# Altium schematic symbol library jlcpcb_2025_04_capacitors_extended_0603.schlib: 3668 symbols (part 4 of 20) (continued)
## 0603N1R4B500CT
designator C?  Capacitance: 1.4pF  (hidden comment: *)
Capacitor, Ceramic (MLCC), 1.4pF, 50V, NP0, SMD 0603; Manufacturer: Walsin Tech Corp; Manufacturer Part Number: 0603N1R4B500CT; Package Size: 0603; JLCPCB Basic Part: No; JLCPCB Part Number: C458895; Supplier 1: LCSC; Category: Capacitors - MLCC; Supplier Part Number 1: C458895; Voltage Rating: 50V; Temperature Coefficient: NP0; RoHS: Yes; ComponentLink1Description: Datasheet; ComponentLink1URL: https://wmsc.lcsc.com/wmsc/upload/file/pdf/v2/lcsc/2304140030_Walsin-Tech-Corp-0603N1R4B500CT_C458895.pdf; ComponentLink2Description: JLCPCB Part URL; ComponentLink2URL: https://jlcpcb.com/partdetail/C458895; ComponentLink3Description: LCSC Part URL; ComponentLink3URL: https://lcsc.com/product-detail/Multilayer-Ceramic-Capacitors-MLCC---SMD-SMT_Walsin-Tech-Corp-Walsin-Tech-Corp-0603N1R4B500CT_C458895.html
footprint CAP-0603 (0603 (1608M) Capacitor)
pins: 1, 2

## 0603N1R5B500CT
designator C?  Capacitance: 1.5pF  (hidden comment: *)
Capacitor, Ceramic (MLCC), 1.5pF, 50V, NP0, SMD 0603; Manufacturer: Walsin Tech Corp; Manufacturer Part Number: 0603N1R5B500CT; Package Size: 0603; JLCPCB Basic Part: No; JLCPCB Part Number: C123541; Supplier 1: LCSC; Category: Capacitors - MLCC; Supplier Part Number 1: C123541; Voltage Rating: 50V; Temperature Coefficient: NP0; RoHS: Yes; ComponentLink1Description: Datasheet; ComponentLink1URL: https://wmsc.lcsc.com/wmsc/upload/file/pdf/v2/lcsc/2304140030_Walsin-Tech-Corp-0603N1R5B500CT_C123541.pdf; ComponentLink2Description: JLCPCB Part URL; ComponentLink2URL: https://jlcpcb.com/partdetail/C123541; ComponentLink3Description: LCSC Part URL; ComponentLink3URL: https://lcsc.com/product-detail/Multilayer-Ceramic-Capacitors-MLCC---SMD-SMT_Walsin-Tech-Corp-Walsin-Tech-Corp-0603N1R5B500CT_C123541.html
footprint CAP-0603 (0603 (1608M) Capacitor)
pins: 1, 2

## 0603N1R5C500CT
designator C?  Capacitance: 1.5pF  (hidden comment: *)
Capacitor, Ceramic (MLCC), 1.5pF, 50V, NP0, SMD 0603; Manufacturer: Walsin Tech Corp; Manufacturer Part Number: 0603N1R5C500CT; Package Size: 0603; JLCPCB Basic Part: No; JLCPCB Part Number: C388037; Supplier 1: LCSC; Category: Capacitors - MLCC; Supplier Part Number 1: C388037; Voltage Rating: 50V; Temperature Coefficient: NP0; RoHS: Yes; ComponentLink1Description: Datasheet; ComponentLink1URL: https://wmsc.lcsc.com/wmsc/upload/file/pdf/v2/lcsc/2304140030_Walsin-Tech-Corp-0603N1R5C500CT_C388037.pdf; ComponentLink2Description: JLCPCB Part URL; ComponentLink2URL: https://jlcpcb.com/partdetail/C388037; ComponentLink3Description: LCSC Part URL; ComponentLink3URL: https://lcsc.com/product-detail/Multilayer-Ceramic-Capacitors-MLCC---SMD-SMT_Walsin-Tech-Corp-Walsin-Tech-Corp-0603N1R5C500CT_C388037.html
footprint CAP-0603 (0603 (1608M) Capacitor)
pins: 1, 2

## 0603N1R8B500CT
designator C?  Capacitance: 1.8pF  (hidden comment: *)
Capacitor, Ceramic (MLCC), 1.8pF, 50V, NP0, SMD 0603; Manufacturer: Walsin Tech Corp; Manufacturer Part Number: 0603N1R8B500CT; Package Size: 0603; JLCPCB Basic Part: No; JLCPCB Part Number: C152917; Supplier 1: LCSC; Category: Capacitors - MLCC; Supplier Part Number 1: C152917; Voltage Rating: 50V; Temperature Coefficient: NP0; RoHS: Yes; ComponentLink1Description: Datasheet; ComponentLink1URL: https://wmsc.lcsc.com/wmsc/upload/file/pdf/v2/lcsc/2304140030_Walsin-Tech-Corp-0603N1R8B500CT_C152917.pdf; ComponentLink2Description: JLCPCB Part URL; ComponentLink2URL: https://jlcpcb.com/partdetail/C152917; ComponentLink3Description: LCSC Part URL; ComponentLink3URL: https://lcsc.com/product-detail/Multilayer-Ceramic-Capacitors-MLCC---SMD-SMT_Walsin-Tech-Corp-Walsin-Tech-Corp-0603N1R8B500CT_C152917.html
footprint CAP-0603 (0603 (1608M) Capacitor)
pins: 1, 2

## 0603N1R8C500CT
designator C?  Capacitance: 1.8pF  (hidden comment: *)
Capacitor, Ceramic (MLCC), 1.8pF, 50V, NP0, SMD 0603; Manufacturer: Walsin Tech Corp; Manufacturer Part Number: 0603N1R8C500CT; Package Size: 0603; JLCPCB Basic Part: No; JLCPCB Part Number: C296051; Supplier 1: LCSC; Category: Capacitors - MLCC; Supplier Part Number 1: C296051; Voltage Rating: 50V; Temperature Coefficient: NP0; RoHS: Yes; ComponentLink1Description: Datasheet; ComponentLink1URL: https://wmsc.lcsc.com/wmsc/upload/file/pdf/v2/lcsc/2304140030_Walsin-Tech-Corp-0603N1R8C500CT_C296051.pdf; ComponentLink2Description: JLCPCB Part URL; ComponentLink2URL: https://jlcpcb.com/partdetail/C296051; ComponentLink3Description: LCSC Part URL; ComponentLink3URL: https://lcsc.com/product-detail/Multilayer-Ceramic-Capacitors-MLCC---SMD-SMT_Walsin-Tech-Corp-Walsin-Tech-Corp-0603N1R8C500CT_C296051.html
footprint CAP-0603 (0603 (1608M) Capacitor)
pins: 1, 2

## 0603N2R0B500CT
designator C?  Capacitance: 2pF  (hidden comment: *)
Capacitor, Ceramic (MLCC), 2pF, 50V, NP0, SMD 0603; Manufacturer: Walsin Tech Corp; Manufacturer Part Number: 0603N2R0B500CT; Package Size: 0603; JLCPCB Basic Part: No; JLCPCB Part Number: C152912; Supplier 1: LCSC; Category: Capacitors - MLCC; Supplier Part Number 1: C152912; Voltage Rating: 50V; Temperature Coefficient: NP0; RoHS: Yes; ComponentLink1Description: Datasheet; ComponentLink1URL: https://wmsc.lcsc.com/wmsc/upload/file/pdf/v2/lcsc/2304140030_Walsin-Tech-Corp-0603N2R0B500CT_C152912.pdf; ComponentLink2Description: JLCPCB Part URL; ComponentLink2URL: https://jlcpcb.com/partdetail/C152912; ComponentLink3Description: LCSC Part URL; ComponentLink3URL: https://lcsc.com/product-detail/Multilayer-Ceramic-Capacitors-MLCC---SMD-SMT_Walsin-Tech-Corp-Walsin-Tech-Corp-0603N2R0B500CT_C152912.html
footprint CAP-0603 (0603 (1608M) Capacitor)
pins: 1, 2

## 0603N2R0C251CT
designator C?  Capacitance: 2pF  (hidden comment: *)
Capacitor, Ceramic (MLCC), 2pF, 250V, NP0, SMD 0603; Manufacturer: Walsin Tech Corp; Manufacturer Part Number: 0603N2R0C251CT; Package Size: 0603; JLCPCB Basic Part: No; JLCPCB Part Number: C555555; Supplier 1: LCSC; Category: Capacitors - MLCC; Supplier Part Number 1: C555555; Voltage Rating: 250V; Temperature Coefficient: NP0; RoHS: Yes; ComponentLink1Description: Datasheet; ComponentLink1URL: https://wmsc.lcsc.com/wmsc/upload/file/pdf/v2/lcsc/2304140030_Walsin-Tech-Corp-0603N2R0C251CT_C555555.pdf; ComponentLink2Description: JLCPCB Part URL; ComponentLink2URL: https://jlcpcb.com/partdetail/C555555; ComponentLink3Description: LCSC Part URL; ComponentLink3URL: https://lcsc.com/product-detail/Multilayer-Ceramic-Capacitors-MLCC---SMD-SMT_Walsin-Tech-Corp-Walsin-Tech-Corp-0603N2R0C251CT_C555555.html
footprint CAP-0603 (0603 (1608M) Capacitor)
pins: 1, 2

## 0603N2R0C500CT
designator C?  Capacitance: 2pF  (hidden comment: *)
Capacitor, Ceramic (MLCC), 2pF, 50V, NP0, SMD 0603; Manufacturer: Walsin Tech Corp; Manufacturer Part Number: 0603N2R0C500CT; Package Size: 0603; JLCPCB Basic Part: No; JLCPCB Part Number: C123547; Supplier 1: LCSC; Category: Capacitors - MLCC; Supplier Part Number 1: C123547; Voltage Rating: 50V; Temperature Coefficient: NP0; RoHS: Yes; ComponentLink1Description: Datasheet; ComponentLink1URL: https://wmsc.lcsc.com/wmsc/upload/file/pdf/v2/lcsc/2304140030_Walsin-Tech-Corp-0603N2R0C500CT_C123547.pdf; ComponentLink2Description: JLCPCB Part URL; ComponentLink2URL: https://jlcpcb.com/partdetail/C123547; ComponentLink3Description: LCSC Part URL; ComponentLink3URL: https://lcsc.com/product-detail/Multilayer-Ceramic-Capacitors-MLCC---SMD-SMT_Walsin-Tech-Corp-Walsin-Tech-Corp-0603N2R0C500CT_C123547.html
footprint CAP-0603 (0603 (1608M) Capacitor)
pins: 1, 2

## 0603N2R2B500CT
designator C?  Capacitance: 2.2pF  (hidden comment: *)
Capacitor, Ceramic (MLCC), 2.2pF, 50V, NP0, SMD 0603; Manufacturer: Walsin Tech Corp; Manufacturer Part Number: 0603N2R2B500CT; Package Size: 0603; JLCPCB Basic Part: No; JLCPCB Part Number: C123548; Supplier 1: LCSC; Category: Capacitors - MLCC; Supplier Part Number 1: C123548; Voltage Rating: 50V; Temperature Coefficient: NP0; RoHS: Yes; ComponentLink1Description: Datasheet; ComponentLink1URL: https://wmsc.lcsc.com/wmsc/upload/file/pdf/v2/lcsc/2304140030_Walsin-Tech-Corp-0603N2R2B500CT_C123548.pdf; ComponentLink2Description: JLCPCB Part URL; ComponentLink2URL: https://jlcpcb.com/partdetail/C123548; ComponentLink3Description: LCSC Part URL; ComponentLink3URL: https://lcsc.com/product-detail/Multilayer-Ceramic-Capacitors-MLCC---SMD-SMT_Walsin-Tech-Corp-Walsin-Tech-Corp-0603N2R2B500CT_C123548.html
footprint CAP-0603 (0603 (1608M) Capacitor)
pins: 1, 2

## 0603N2R2C500CT
designator C?  Capacitance: 2.2pF  (hidden comment: *)
Capacitor, Ceramic (MLCC), 2.2pF, 50V, NP0, SMD 0603; Manufacturer: Walsin Tech Corp; Manufacturer Part Number: 0603N2R2C500CT; Package Size: 0603; JLCPCB Basic Part: No; JLCPCB Part Number: C388044; Supplier 1: LCSC; Category: Capacitors - MLCC; Supplier Part Number 1: C388044; Voltage Rating: 50V; Temperature Coefficient: NP0; RoHS: Yes; ComponentLink1Description: Datasheet; ComponentLink1URL: https://wmsc.lcsc.com/wmsc/upload/file/pdf/v2/lcsc/2304140030_Walsin-Tech-Corp-0603N2R2C500CT_C388044.pdf; ComponentLink2Description: JLCPCB Part URL; ComponentLink2URL: https://jlcpcb.com/partdetail/C388044; ComponentLink3Description: LCSC Part URL; ComponentLink3URL: https://lcsc.com/product-detail/Multilayer-Ceramic-Capacitors-MLCC---SMD-SMT_Walsin-Tech-Corp-Walsin-Tech-Corp-0603N2R2C500CT_C388044.html
footprint CAP-0603 (0603 (1608M) Capacitor)
pins: 1, 2

## 0603N2R2C500CT-C
designator C?  Capacitance: 2.2pF  (hidden comment: *)
Capacitor, Ceramic (MLCC), 2.2pF, 50V, NP0, SMD 0603; Manufacturer: Walsin Tech Corp; Manufacturer Part Number: 0603N2R2C500CT-C; Package Size: 0603; JLCPCB Basic Part: No; JLCPCB Part Number: C2991447; Supplier 1: LCSC; Category: Capacitors - MLCC; Supplier Part Number 1: C2991447; Voltage Rating: 50V; Temperature Coefficient: NP0; RoHS: Yes; ComponentLink1Description: Datasheet; ComponentLink1URL: https://wmsc.lcsc.com/wmsc/upload/file/pdf/v2/lcsc/2204131745_Walsin-Tech-Corp-0603N2R2C500CT-C_C2991447.pdf; ComponentLink2Description: JLCPCB Part URL; ComponentLink2URL: https://jlcpcb.com/partdetail/C2991447; ComponentLink3Description: LCSC Part URL; ComponentLink3URL: https://lcsc.com/product-detail/Multilayer-Ceramic-Capacitors-MLCC---SMD-SMT_Walsin-Tech-Corp-Walsin-Tech-Corp-0603N2R2C500CT-C_C2991447.html
footprint CAP-0603 (0603 (1608M) Capacitor)
pins: 1, 2

## 0603N2R4B500CT
designator C?  Capacitance: 2.4pF  (hidden comment: *)
Capacitor, Ceramic (MLCC), 2.4pF, 50V, NP0, SMD 0603; Manufacturer: Walsin Tech Corp; Manufacturer Part Number: 0603N2R4B500CT; Package Size: 0603; JLCPCB Basic Part: No; JLCPCB Part Number: C123550; Supplier 1: LCSC; Category: Capacitors - MLCC; Supplier Part Number 1: C123550; Voltage Rating: 50V; Temperature Coefficient: NP0; RoHS: Yes; ComponentLink1Description: Datasheet; ComponentLink1URL: https://wmsc.lcsc.com/wmsc/upload/file/pdf/v2/lcsc/2304140030_Walsin-Tech-Corp-0603N2R4B500CT_C123550.pdf; ComponentLink2Description: JLCPCB Part URL; ComponentLink2URL: https://jlcpcb.com/partdetail/C123550; ComponentLink3Description: LCSC Part URL; ComponentLink3URL: https://lcsc.com/product-detail/Multilayer-Ceramic-Capacitors-MLCC---SMD-SMT_Walsin-Tech-Corp-Walsin-Tech-Corp-0603N2R4B500CT_C123550.html
footprint CAP-0603 (0603 (1608M) Capacitor)
pins: 1, 2

## 0603N2R5B500CT
designator C?  Capacitance: 2.5pF  (hidden comment: *)
Capacitor, Ceramic (MLCC), 2.5pF, 50V, NP0, SMD 0603; Manufacturer: Walsin Tech Corp; Manufacturer Part Number: 0603N2R5B500CT; Package Size: 0603; JLCPCB Basic Part: No; JLCPCB Part Number: C123551; Supplier 1: LCSC; Category: Capacitors - MLCC; Supplier Part Number 1: C123551; Voltage Rating: 50V; Temperature Coefficient: NP0; RoHS: Yes; ComponentLink1Description: Datasheet; ComponentLink1URL: https://wmsc.lcsc.com/wmsc/upload/file/pdf/v2/lcsc/2304140030_Walsin-Tech-Corp-0603N2R5B500CT_C123551.pdf; ComponentLink2Description: JLCPCB Part URL; ComponentLink2URL: https://jlcpcb.com/partdetail/C123551; ComponentLink3Description: LCSC Part URL; ComponentLink3URL: https://lcsc.com/product-detail/Multilayer-Ceramic-Capacitors-MLCC---SMD-SMT_Walsin-Tech-Corp-Walsin-Tech-Corp-0603N2R5B500CT_C123551.html
footprint CAP-0603 (0603 (1608M) Capacitor)
pins: 1, 2

## 0603N2R5C500CT
designator C?  Capacitance: 2.5pF  (hidden comment: *)
Capacitor, Ceramic (MLCC), 2.5pF, 50V, NP0, SMD 0603; Manufacturer: Walsin Tech Corp; Manufacturer Part Number: 0603N2R5C500CT; Package Size: 0603; JLCPCB Basic Part: No; JLCPCB Part Number: C296059; Supplier 1: LCSC; Category: Capacitors - MLCC; Supplier Part Number 1: C296059; Voltage Rating: 50V; Temperature Coefficient: NP0; RoHS: Yes; ComponentLink1Description: Datasheet; ComponentLink1URL: https://wmsc.lcsc.com/wmsc/upload/file/pdf/v2/lcsc/2304140030_Walsin-Tech-Corp-0603N2R5C500CT_C296059.pdf; ComponentLink2Description: JLCPCB Part URL; ComponentLink2URL: https://jlcpcb.com/partdetail/C296059; ComponentLink3Description: LCSC Part URL; ComponentLink3URL: https://lcsc.com/product-detail/Multilayer-Ceramic-Capacitors-MLCC---SMD-SMT_Walsin-Tech-Corp-Walsin-Tech-Corp-0603N2R5C500CT_C296059.html
footprint CAP-0603 (0603 (1608M) Capacitor)
pins: 1, 2

## 0603N2R7B500CT
designator C?  Capacitance: 2.7pF  (hidden comment: *)
Capacitor, Ceramic (MLCC), 2.7pF, 50V, NP0, SMD 0603; Manufacturer: Walsin Tech Corp; Manufacturer Part Number: 0603N2R7B500CT; Package Size: 0603; JLCPCB Basic Part: No; JLCPCB Part Number: C123552; Supplier 1: LCSC; Category: Capacitors - MLCC; Supplier Part Number 1: C123552; Voltage Rating: 50V; Temperature Coefficient: NP0; RoHS: Yes; ComponentLink1Description: Datasheet; ComponentLink1URL: https://wmsc.lcsc.com/wmsc/upload/file/pdf/v2/lcsc/2304140030_Walsin-Tech-Corp-0603N2R7B500CT_C123552.pdf; ComponentLink2Description: JLCPCB Part URL; ComponentLink2URL: https://jlcpcb.com/partdetail/C123552; ComponentLink3Description: LCSC Part URL; ComponentLink3URL: https://lcsc.com/product-detail/Multilayer-Ceramic-Capacitors-MLCC---SMD-SMT_Walsin-Tech-Corp-Walsin-Tech-Corp-0603N2R7B500CT_C123552.html
footprint CAP-0603 (0603 (1608M) Capacitor)
pins: 1, 2

## 0603N2R7C500CT
designator C?  Capacitance: 2.7pF  (hidden comment: *)
Capacitor, Ceramic (MLCC), 2.7pF, 50V, NP0, SMD 0603; Manufacturer: Walsin Tech Corp; Manufacturer Part Number: 0603N2R7C500CT; Package Size: 0603; JLCPCB Basic Part: No; JLCPCB Part Number: C123553; Supplier 1: LCSC; Category: Capacitors - MLCC; Supplier Part Number 1: C123553; Voltage Rating: 50V; Temperature Coefficient: NP0; RoHS: Yes; ComponentLink1Description: Datasheet; ComponentLink1URL: https://wmsc.lcsc.com/wmsc/upload/file/pdf/v2/lcsc/2304140030_Walsin-Tech-Corp-0603N2R7C500CT_C123553.pdf; ComponentLink2Description: JLCPCB Part URL; ComponentLink2URL: https://jlcpcb.com/partdetail/C123553; ComponentLink3Description: LCSC Part URL; ComponentLink3URL: https://lcsc.com/product-detail/Multilayer-Ceramic-Capacitors-MLCC---SMD-SMT_Walsin-Tech-Corp-Walsin-Tech-Corp-0603N2R7C500CT_C123553.html
footprint CAP-0603 (0603 (1608M) Capacitor)
pins: 1, 2

## 0603N3R0B500CT
designator C?  Capacitance: 3pF  (hidden comment: *)
Capacitor, Ceramic (MLCC), 3pF, 50V, NP0, SMD 0603; Manufacturer: Walsin Tech Corp; Manufacturer Part Number: 0603N3R0B500CT; Package Size: 0603; JLCPCB Basic Part: No; JLCPCB Part Number: C123560; Supplier 1: LCSC; Category: Capacitors - MLCC; Supplier Part Number 1: C123560; Voltage Rating: 50V; Temperature Coefficient: NP0; RoHS: Yes; ComponentLink1Description: Datasheet; ComponentLink1URL: https://wmsc.lcsc.com/wmsc/upload/file/pdf/v2/lcsc/2304140030_Walsin-Tech-Corp-0603N3R0B500CT_C123560.pdf; ComponentLink2Description: JLCPCB Part URL; ComponentLink2URL: https://jlcpcb.com/partdetail/C123560; ComponentLink3Description: LCSC Part URL; ComponentLink3URL: https://lcsc.com/product-detail/Multilayer-Ceramic-Capacitors-MLCC---SMD-SMT_Walsin-Tech-Corp-Walsin-Tech-Corp-0603N3R0B500CT_C123560.html
footprint CAP-0603 (0603 (1608M) Capacitor)
pins: 1, 2

## 0603N3R3B500CT
designator C?  Capacitance: 3.3pF  (hidden comment: *)
Capacitor, Ceramic (MLCC), 3.3pF, 50V, NP0, SMD 0603; Manufacturer: Walsin Tech Corp; Manufacturer Part Number: 0603N3R3B500CT; Package Size: 0603; JLCPCB Basic Part: No; JLCPCB Part Number: C509265; Supplier 1: LCSC; Category: Capacitors - MLCC; Supplier Part Number 1: C509265; Voltage Rating: 50V; Temperature Coefficient: NP0; RoHS: Yes; ComponentLink1Description: Datasheet; ComponentLink1URL: https://wmsc.lcsc.com/wmsc/upload/file/pdf/v2/lcsc/2304140030_Walsin-Tech-Corp-0603N3R3B500CT_C509265.pdf; ComponentLink2Description: JLCPCB Part URL; ComponentLink2URL: https://jlcpcb.com/partdetail/C509265; ComponentLink3Description: LCSC Part URL; ComponentLink3URL: https://lcsc.com/product-detail/Multilayer-Ceramic-Capacitors-MLCC---SMD-SMT_Walsin-Tech-Corp-Walsin-Tech-Corp-0603N3R3B500CT_C509265.html
footprint CAP-0603 (0603 (1608M) Capacitor)
pins: 1, 2

## 0603N3R3C500CT
designator C?  Capacitance: 3.3pF  (hidden comment: *)
Capacitor, Ceramic (MLCC), 3.3pF, 50V, NP0, SMD 0603; Manufacturer: Walsin Tech Corp; Manufacturer Part Number: 0603N3R3C500CT; Package Size: 0603; JLCPCB Basic Part: No; JLCPCB Part Number: C123563; Supplier 1: LCSC; Category: Capacitors - MLCC; Supplier Part Number 1: C123563; Voltage Rating: 50V; Temperature Coefficient: NP0; RoHS: Yes; ComponentLink1Description: Datasheet; ComponentLink1URL: https://wmsc.lcsc.com/wmsc/upload/file/pdf/v2/lcsc/2304140030_Walsin-Tech-Corp-0603N3R3C500CT_C123563.pdf; ComponentLink2Description: JLCPCB Part URL; ComponentLink2URL: https://jlcpcb.com/partdetail/C123563; ComponentLink3Description: LCSC Part URL; ComponentLink3URL: https://lcsc.com/product-detail/Multilayer-Ceramic-Capacitors-MLCC---SMD-SMT_Walsin-Tech-Corp-Walsin-Tech-Corp-0603N3R3C500CT_C123563.html
footprint CAP-0603 (0603 (1608M) Capacitor)
pins: 1, 2

## 0603N3R5C500CT
designator C?  Capacitance: 3.5pF  (hidden comment: *)
Capacitor, Ceramic (MLCC), 3.5pF, 50V, NP0, SMD 0603; Manufacturer: Walsin Tech Corp; Manufacturer Part Number: 0603N3R5C500CT; Package Size: 0603; JLCPCB Basic Part: No; JLCPCB Part Number: C388052; Supplier 1: LCSC; Category: Capacitors - MLCC; Supplier Part Number 1: C388052; Voltage Rating: 50V; Temperature Coefficient: NP0; RoHS: Yes; ComponentLink1Description: Datasheet; ComponentLink1URL: https://wmsc.lcsc.com/wmsc/upload/file/pdf/v2/lcsc/2304140030_Walsin-Tech-Corp-0603N3R5C500CT_C388052.pdf; ComponentLink2Description: JLCPCB Part URL; ComponentLink2URL: https://jlcpcb.com/partdetail/C388052; ComponentLink3Description: LCSC Part URL; ComponentLink3URL: https://lcsc.com/product-detail/Multilayer-Ceramic-Capacitors-MLCC---SMD-SMT_Walsin-Tech-Corp-Walsin-Tech-Corp-0603N3R5C500CT_C388052.html
footprint CAP-0603 (0603 (1608M) Capacitor)
pins: 1, 2

## 0603N3R6C500CT
designator C?  Capacitance: 3.6pF  (hidden comment: *)
Capacitor, Ceramic (MLCC), 3.6pF, 50V, SMD 0603; Manufacturer: Walsin Tech Corp; Manufacturer Part Number: 0603N3R6C500CT; Package Size: 0603; JLCPCB Basic Part: No; JLCPCB Part Number: C296064; Supplier 1: LCSC; Category: Capacitors - MLCC; Supplier Part Number 1: C296064; Voltage Rating: 50V; RoHS: Yes; ComponentLink1Description: Datasheet; ComponentLink1URL: https://wmsc.lcsc.com/wmsc/upload/file/pdf/v2/lcsc/2304140030_Walsin-Tech-Corp-0603N3R6C500CT_C296064.pdf; ComponentLink2Description: JLCPCB Part URL; ComponentLink2URL: https://jlcpcb.com/partdetail/C296064; ComponentLink3Description: LCSC Part URL; ComponentLink3URL: https://lcsc.com/product-detail/Multilayer-Ceramic-Capacitors-MLCC---SMD-SMT_Walsin-Tech-Corp-Walsin-Tech-Corp-0603N3R6C500CT_C296064.html
footprint CAP-0603 (0603 (1608M) Capacitor)
pins: 1, 2

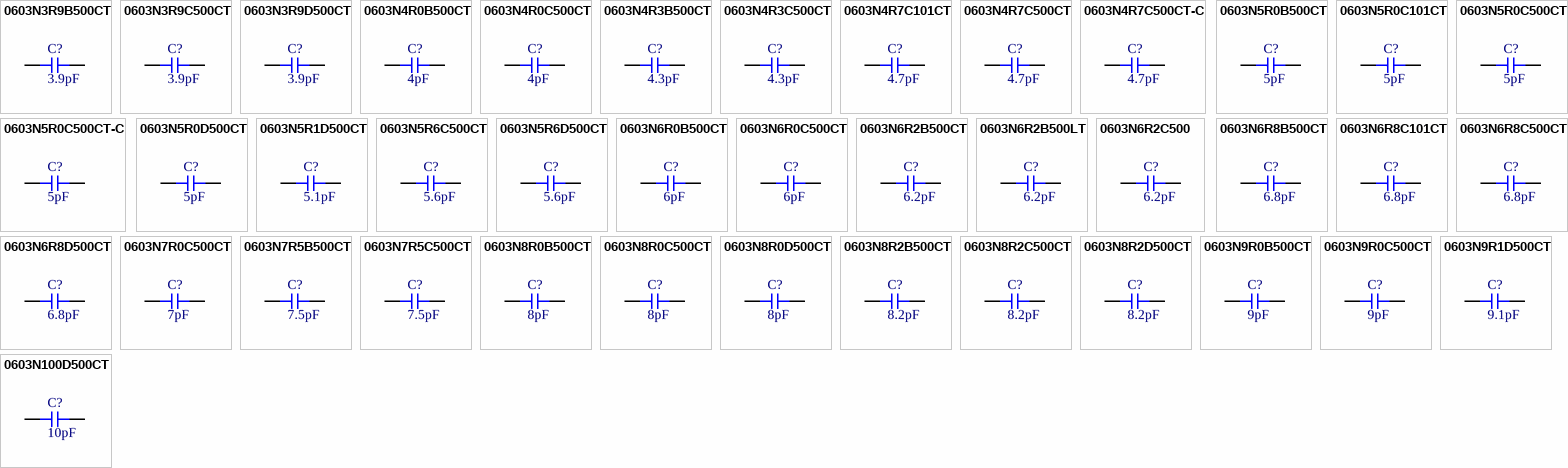
[diagram p15: symbols 0603N3R9B500CT to 0603N100D500CT]

## 0603N3R9B500CT
designator C?  Capacitance: 3.9pF  (hidden comment: *)
Capacitor, Ceramic (MLCC), 3.9pF, 50V, NP0, SMD 0603; Manufacturer: Walsin Tech Corp; Manufacturer Part Number: 0603N3R9B500CT; Package Size: 0603; JLCPCB Basic Part: No; JLCPCB Part Number: C123565; Supplier 1: LCSC; Category: Capacitors - MLCC; Supplier Part Number 1: C123565; Voltage Rating: 50V; Temperature Coefficient: NP0; RoHS: Yes; ComponentLink1Description: Datasheet; ComponentLink1URL: https://wmsc.lcsc.com/wmsc/upload/file/pdf/v2/lcsc/2304140030_Walsin-Tech-Corp-0603N3R9B500CT_C123565.pdf; ComponentLink2Description: JLCPCB Part URL; ComponentLink2URL: https://jlcpcb.com/partdetail/C123565; ComponentLink3Description: LCSC Part URL; ComponentLink3URL: https://lcsc.com/product-detail/Multilayer-Ceramic-Capacitors-MLCC---SMD-SMT_Walsin-Tech-Corp-Walsin-Tech-Corp-0603N3R9B500CT_C123565.html
footprint CAP-0603 (0603 (1608M) Capacitor)
pins: 1, 2

## 0603N3R9C500CT
designator C?  Capacitance: 3.9pF  (hidden comment: *)
Capacitor, Ceramic (MLCC), 3.9pF, 50V, NP0, SMD 0603; Manufacturer: Walsin Tech Corp; Manufacturer Part Number: 0603N3R9C500CT; Package Size: 0603; JLCPCB Basic Part: No; JLCPCB Part Number: C123566; Supplier 1: LCSC; Category: Capacitors - MLCC; Supplier Part Number 1: C123566; Voltage Rating: 50V; Temperature Coefficient: NP0; RoHS: Yes; ComponentLink1Description: Datasheet; ComponentLink1URL: https://wmsc.lcsc.com/wmsc/upload/file/pdf/v2/lcsc/2304140030_Walsin-Tech-Corp-0603N3R9C500CT_C123566.pdf; ComponentLink2Description: JLCPCB Part URL; ComponentLink2URL: https://jlcpcb.com/partdetail/C123566; ComponentLink3Description: LCSC Part URL; ComponentLink3URL: https://lcsc.com/product-detail/Multilayer-Ceramic-Capacitors-MLCC---SMD-SMT_Walsin-Tech-Corp-Walsin-Tech-Corp-0603N3R9C500CT_C123566.html
footprint CAP-0603 (0603 (1608M) Capacitor)
pins: 1, 2

## 0603N3R9D500CT
designator C?  Capacitance: 3.9pF  (hidden comment: *)
Capacitor, Ceramic (MLCC), 3.9pF, 50V, NP0, SMD 0603; Manufacturer: Walsin Tech Corp; Manufacturer Part Number: 0603N3R9D500CT; Package Size: 0603; JLCPCB Basic Part: No; JLCPCB Part Number: C458905; Supplier 1: LCSC; Category: Capacitors - MLCC; Supplier Part Number 1: C458905; Voltage Rating: 50V; Temperature Coefficient: NP0; RoHS: Yes; ComponentLink1Description: Datasheet; ComponentLink1URL: https://wmsc.lcsc.com/wmsc/upload/file/pdf/v2/lcsc/2304140030_Walsin-Tech-Corp-0603N3R9D500CT_C458905.pdf; ComponentLink2Description: JLCPCB Part URL; ComponentLink2URL: https://jlcpcb.com/partdetail/C458905; ComponentLink3Description: LCSC Part URL; ComponentLink3URL: https://lcsc.com/product-detail/Multilayer-Ceramic-Capacitors-MLCC---SMD-SMT_Walsin-Tech-Corp-Walsin-Tech-Corp-0603N3R9D500CT_C458905.html
footprint CAP-0603 (0603 (1608M) Capacitor)
pins: 1, 2

## 0603N4R0B500CT
designator C?  Capacitance: 4pF  (hidden comment: *)
Capacitor, Ceramic (MLCC), 4pF, 50V, NP0, SMD 0603; Manufacturer: Walsin Tech Corp; Manufacturer Part Number: 0603N4R0B500CT; Package Size: 0603; JLCPCB Basic Part: No; JLCPCB Part Number: C123574; Supplier 1: LCSC; Category: Capacitors - MLCC; Supplier Part Number 1: C123574; Voltage Rating: 50V; Temperature Coefficient: NP0; RoHS: Yes; ComponentLink1Description: Datasheet; ComponentLink1URL: https://wmsc.lcsc.com/wmsc/upload/file/pdf/v2/lcsc/2304140030_Walsin-Tech-Corp-0603N4R0B500CT_C123574.pdf; ComponentLink2Description: JLCPCB Part URL; ComponentLink2URL: https://jlcpcb.com/partdetail/C123574; ComponentLink3Description: LCSC Part URL; ComponentLink3URL: https://lcsc.com/product-detail/Multilayer-Ceramic-Capacitors-MLCC---SMD-SMT_Walsin-Tech-Corp-Walsin-Tech-Corp-0603N4R0B500CT_C123574.html
footprint CAP-0603 (0603 (1608M) Capacitor)
pins: 1, 2

## 0603N4R0C500CT
designator C?  Capacitance: 4pF  (hidden comment: *)
Capacitor, Ceramic (MLCC), 4pF, 50V, NP0, SMD 0603; Manufacturer: Walsin Tech Corp; Manufacturer Part Number: 0603N4R0C500CT; Package Size: 0603; JLCPCB Basic Part: No; JLCPCB Part Number: C123575; Supplier 1: LCSC; Category: Capacitors - MLCC; Supplier Part Number 1: C123575; Voltage Rating: 50V; Temperature Coefficient: NP0; RoHS: Yes; ComponentLink1Description: Datasheet; ComponentLink1URL: https://wmsc.lcsc.com/wmsc/upload/file/pdf/v2/lcsc/2304140030_Walsin-Tech-Corp-0603N4R0C500CT_C123575.pdf; ComponentLink2Description: JLCPCB Part URL; ComponentLink2URL: https://jlcpcb.com/partdetail/C123575; ComponentLink3Description: LCSC Part URL; ComponentLink3URL: https://lcsc.com/product-detail/Multilayer-Ceramic-Capacitors-MLCC---SMD-SMT_Walsin-Tech-Corp-Walsin-Tech-Corp-0603N4R0C500CT_C123575.html
footprint CAP-0603 (0603 (1608M) Capacitor)
pins: 1, 2

## 0603N4R3B500CT
designator C?  Capacitance: 4.3pF  (hidden comment: *)
Capacitor, Ceramic (MLCC), 4.3pF, 50V, NP0, SMD 0603; Manufacturer: Walsin Tech Corp; Manufacturer Part Number: 0603N4R3B500CT; Package Size: 0603; JLCPCB Basic Part: No; JLCPCB Part Number: C388056; Supplier 1: LCSC; Category: Capacitors - MLCC; Supplier Part Number 1: C388056; Voltage Rating: 50V; Temperature Coefficient: NP0; RoHS: Yes; ComponentLink1Description: Datasheet; ComponentLink1URL: https://wmsc.lcsc.com/wmsc/upload/file/pdf/v2/lcsc/2304140030_Walsin-Tech-Corp-0603N4R3B500CT_C388056.pdf; ComponentLink2Description: JLCPCB Part URL; ComponentLink2URL: https://jlcpcb.com/partdetail/C388056; ComponentLink3Description: LCSC Part URL; ComponentLink3URL: https://lcsc.com/product-detail/Multilayer-Ceramic-Capacitors-MLCC---SMD-SMT_Walsin-Tech-Corp-Walsin-Tech-Corp-0603N4R3B500CT_C388056.html
footprint CAP-0603 (0603 (1608M) Capacitor)
pins: 1, 2

## 0603N4R3C500CT
designator C?  Capacitance: 4.3pF  (hidden comment: *)
Capacitor, Ceramic (MLCC), 4.3pF, 50V, NP0, SMD 0603; Manufacturer: Walsin Tech Corp; Manufacturer Part Number: 0603N4R3C500CT; Package Size: 0603; JLCPCB Basic Part: No; JLCPCB Part Number: C424850; Supplier 1: LCSC; Category: Capacitors - MLCC; Supplier Part Number 1: C424850; Voltage Rating: 50V; Temperature Coefficient: NP0; RoHS: Yes; ComponentLink1Description: Datasheet; ComponentLink1URL: https://wmsc.lcsc.com/wmsc/upload/file/pdf/v2/lcsc/2304140030_Walsin-Tech-Corp-0603N4R3C500CT_C424850.pdf; ComponentLink2Description: JLCPCB Part URL; ComponentLink2URL: https://jlcpcb.com/partdetail/C424850; ComponentLink3Description: LCSC Part URL; ComponentLink3URL: https://lcsc.com/product-detail/Multilayer-Ceramic-Capacitors-MLCC---SMD-SMT_Walsin-Tech-Corp-Walsin-Tech-Corp-0603N4R3C500CT_C424850.html
footprint CAP-0603 (0603 (1608M) Capacitor)
pins: 1, 2

## 0603N4R7C101CT
designator C?  Capacitance: 4.7pF  (hidden comment: *)
Capacitor, Ceramic (MLCC), 4.7pF, 100V, NP0, SMD 0603; Manufacturer: Walsin Tech Corp; Manufacturer Part Number: 0603N4R7C101CT; Package Size: 0603; JLCPCB Basic Part: No; JLCPCB Part Number: C2918066; Supplier 1: LCSC; Category: Capacitors - MLCC; Supplier Part Number 1: C2918066; Voltage Rating: 100V; Temperature Coefficient: NP0; RoHS: Yes; ComponentLink1Description: Datasheet; ComponentLink1URL: https://wmsc.lcsc.com/wmsc/upload/file/pdf/v2/lcsc/2111181830_Walsin-Tech-Corp-0603N4R7C101CT_C2918066.pdf; ComponentLink2Description: JLCPCB Part URL; ComponentLink2URL: https://jlcpcb.com/partdetail/C2918066; ComponentLink3Description: LCSC Part URL; ComponentLink3URL: https://lcsc.com/product-detail/Multilayer-Ceramic-Capacitors-MLCC---SMD-SMT_Walsin-Tech-Corp-Walsin-Tech-Corp-0603N4R7C101CT_C2918066.html
footprint CAP-0603 (0603 (1608M) Capacitor)
pins: 1, 2

## 0603N4R7C500CT
designator C?  Capacitance: 4.7pF  (hidden comment: *)
Capacitor, Ceramic (MLCC), 4.7pF, 50V, NP0, SMD 0603; Manufacturer: Walsin Tech Corp; Manufacturer Part Number: 0603N4R7C500CT; Package Size: 0603; JLCPCB Basic Part: No; JLCPCB Part Number: C314302; Supplier 1: LCSC; Category: Capacitors - MLCC; Supplier Part Number 1: C314302; Voltage Rating: 50V; Temperature Coefficient: NP0; RoHS: Yes; ComponentLink1Description: Datasheet; ComponentLink1URL: https://wmsc.lcsc.com/wmsc/upload/file/pdf/v2/lcsc/2304140030_Walsin-Tech-Corp-0603N4R7C500CT_C314302.pdf; ComponentLink2Description: JLCPCB Part URL; ComponentLink2URL: https://jlcpcb.com/partdetail/C314302; ComponentLink3Description: LCSC Part URL; ComponentLink3URL: https://lcsc.com/product-detail/Multilayer-Ceramic-Capacitors-MLCC---SMD-SMT_Walsin-Tech-Corp-Walsin-Tech-Corp-0603N4R7C500CT_C314302.html
footprint CAP-0603 (0603 (1608M) Capacitor)
pins: 1, 2

## 0603N4R7C500CT-C
designator C?  Capacitance: 4.7pF  (hidden comment: *)
Capacitor, Ceramic (MLCC), 4.7pF, 50V, NP0, SMD 0603; Manufacturer: Walsin Tech Corp; Manufacturer Part Number: 0603N4R7C500CT-C; Package Size: 0603; JLCPCB Basic Part: No; JLCPCB Part Number: C2991432; Supplier 1: LCSC; Category: Capacitors - MLCC; Supplier Part Number 1: C2991432; Voltage Rating: 50V; Temperature Coefficient: NP0; RoHS: Yes; ComponentLink1Description: Datasheet; ComponentLink1URL: https://wmsc.lcsc.com/wmsc/upload/file/pdf/v2/lcsc/2204131745_Walsin-Tech-Corp-0603N4R7C500CT-C_C2991432.pdf; ComponentLink2Description: JLCPCB Part URL; ComponentLink2URL: https://jlcpcb.com/partdetail/C2991432; ComponentLink3Description: LCSC Part URL; ComponentLink3URL: https://lcsc.com/product-detail/Multilayer-Ceramic-Capacitors-MLCC---SMD-SMT_Walsin-Tech-Corp-Walsin-Tech-Corp-0603N4R7C500CT-C_C2991432.html
footprint CAP-0603 (0603 (1608M) Capacitor)
pins: 1, 2

## 0603N5R0B500CT
designator C?  Capacitance: 5pF  (hidden comment: *)
Capacitor, Ceramic (MLCC), 5pF, 50V, NP0, SMD 0603; Manufacturer: Walsin Tech Corp; Manufacturer Part Number: 0603N5R0B500CT; Package Size: 0603; JLCPCB Basic Part: No; JLCPCB Part Number: C237228; Supplier 1: LCSC; Category: Capacitors - MLCC; Supplier Part Number 1: C237228; Voltage Rating: 50V; Temperature Coefficient: NP0; RoHS: Yes; ComponentLink1Description: Datasheet; ComponentLink1URL: https://wmsc.lcsc.com/wmsc/upload/file/pdf/v2/lcsc/2304140030_Walsin-Tech-Corp-0603N5R0B500CT_C237228.pdf; ComponentLink2Description: JLCPCB Part URL; ComponentLink2URL: https://jlcpcb.com/partdetail/C237228; ComponentLink3Description: LCSC Part URL; ComponentLink3URL: https://lcsc.com/product-detail/Multilayer-Ceramic-Capacitors-MLCC---SMD-SMT_Walsin-Tech-Corp-Walsin-Tech-Corp-0603N5R0B500CT_C237228.html
footprint CAP-0603 (0603 (1608M) Capacitor)
pins: 1, 2

## 0603N5R0C101CT
designator C?  Capacitance: 5pF  (hidden comment: *)
Capacitor, Ceramic (MLCC), 5pF, 100V, NP0, SMD 0603; Manufacturer: Walsin Tech Corp; Manufacturer Part Number: 0603N5R0C101CT; Package Size: 0603; JLCPCB Basic Part: No; JLCPCB Part Number: C123581; Supplier 1: LCSC; Category: Capacitors - MLCC; Supplier Part Number 1: C123581; Voltage Rating: 100V; Temperature Coefficient: NP0; RoHS: Yes; ComponentLink1Description: Datasheet; ComponentLink1URL: https://wmsc.lcsc.com/wmsc/upload/file/pdf/v2/lcsc/2304140030_Walsin-Tech-Corp-0603N5R0C101CT_C123581.pdf; ComponentLink2Description: JLCPCB Part URL; ComponentLink2URL: https://jlcpcb.com/partdetail/C123581; ComponentLink3Description: LCSC Part URL; ComponentLink3URL: https://lcsc.com/product-detail/Multilayer-Ceramic-Capacitors-MLCC---SMD-SMT_Walsin-Tech-Corp-Walsin-Tech-Corp-0603N5R0C101CT_C123581.html
footprint CAP-0603 (0603 (1608M) Capacitor)
pins: 1, 2

## 0603N5R0C500CT
designator C?  Capacitance: 5pF  (hidden comment: *)
Capacitor, Ceramic (MLCC), 5pF, 50V, NP0, SMD 0603; Manufacturer: Walsin Tech Corp; Manufacturer Part Number: 0603N5R0C500CT; Package Size: 0603; JLCPCB Basic Part: No; JLCPCB Part Number: C314284; Supplier 1: LCSC; Category: Capacitors - MLCC; Supplier Part Number 1: C314284; Voltage Rating: 50V; Temperature Coefficient: NP0; RoHS: Yes; ComponentLink1Description: Datasheet; ComponentLink1URL: https://wmsc.lcsc.com/wmsc/upload/file/pdf/v2/lcsc/2304140030_Walsin-Tech-Corp-0603N5R0C500CT_C314284.pdf; ComponentLink2Description: JLCPCB Part URL; ComponentLink2URL: https://jlcpcb.com/partdetail/C314284; ComponentLink3Description: LCSC Part URL; ComponentLink3URL: https://lcsc.com/product-detail/Multilayer-Ceramic-Capacitors-MLCC---SMD-SMT_Walsin-Tech-Corp-Walsin-Tech-Corp-0603N5R0C500CT_C314284.html
footprint CAP-0603 (0603 (1608M) Capacitor)
pins: 1, 2

## 0603N5R0C500CT-C
designator C?  Capacitance: 5pF  (hidden comment: *)
Capacitor, Ceramic (MLCC), 5pF, 50V, NP0, SMD 0603; Manufacturer: Walsin Tech Corp; Manufacturer Part Number: 0603N5R0C500CT-C; Package Size: 0603; JLCPCB Basic Part: No; JLCPCB Part Number: C2991462; Supplier 1: LCSC; Category: Capacitors - MLCC; Supplier Part Number 1: C2991462; Voltage Rating: 50V; Temperature Coefficient: NP0; RoHS: Yes; ComponentLink1Description: Datasheet; ComponentLink1URL: https://wmsc.lcsc.com/wmsc/upload/file/pdf/v2/lcsc/2204131745_Walsin-Tech-Corp-0603N5R0C500CT-C_C2991462.pdf; ComponentLink2Description: JLCPCB Part URL; ComponentLink2URL: https://jlcpcb.com/partdetail/C2991462; ComponentLink3Description: LCSC Part URL; ComponentLink3URL: https://lcsc.com/product-detail/Multilayer-Ceramic-Capacitors-MLCC---SMD-SMT_Walsin-Tech-Corp-Walsin-Tech-Corp-0603N5R0C500CT-C_C2991462.html
footprint CAP-0603 (0603 (1608M) Capacitor)
pins: 1, 2

## 0603N5R0D500CT
designator C?  Capacitance: 5pF  (hidden comment: *)
Capacitor, Ceramic (MLCC), 5pF, 50V, NP0, SMD 0603; Manufacturer: Walsin Tech Corp; Manufacturer Part Number: 0603N5R0D500CT; Package Size: 0603; JLCPCB Basic Part: No; JLCPCB Part Number: C2886129; Supplier 1: LCSC; Category: Capacitors - MLCC; Supplier Part Number 1: C2886129; Voltage Rating: 50V; Temperature Coefficient: NP0; RoHS: Yes; ComponentLink1Description: Datasheet; ComponentLink1URL: https://wmsc.lcsc.com/wmsc/upload/file/pdf/v2/lcsc/2108170930_Walsin-Tech-Corp-0603N5R0D500CT_C2886129.pdf; ComponentLink2Description: JLCPCB Part URL; ComponentLink2URL: https://jlcpcb.com/partdetail/C2886129; ComponentLink3Description: LCSC Part URL; ComponentLink3URL: https://lcsc.com/product-detail/Multilayer-Ceramic-Capacitors-MLCC---SMD-SMT_Walsin-Tech-Corp-Walsin-Tech-Corp-0603N5R0D500CT_C2886129.html
footprint CAP-0603 (0603 (1608M) Capacitor)
pins: 1, 2

## 0603N5R1D500CT
designator C?  Capacitance: 5.1pF  (hidden comment: *)
Capacitor, Ceramic (MLCC), 5.1pF, 50V, NP0, SMD 0603; Manufacturer: Walsin Tech Corp; Manufacturer Part Number: 0603N5R1D500CT; Package Size: 0603; JLCPCB Basic Part: No; JLCPCB Part Number: C296066; Supplier 1: LCSC; Category: Capacitors - MLCC; Supplier Part Number 1: C296066; Voltage Rating: 50V; Temperature Coefficient: NP0; RoHS: Yes; ComponentLink1Description: Datasheet; ComponentLink1URL: https://wmsc.lcsc.com/wmsc/upload/file/pdf/v2/lcsc/2304140030_Walsin-Tech-Corp-0603N5R1D500CT_C296066.pdf; ComponentLink2Description: JLCPCB Part URL; ComponentLink2URL: https://jlcpcb.com/partdetail/C296066; ComponentLink3Description: LCSC Part URL; ComponentLink3URL: https://lcsc.com/product-detail/Multilayer-Ceramic-Capacitors-MLCC---SMD-SMT_Walsin-Tech-Corp-Walsin-Tech-Corp-0603N5R1D500CT_C296066.html
footprint CAP-0603 (0603 (1608M) Capacitor)
pins: 1, 2

## 0603N5R6C500CT
designator C?  Capacitance: 5.6pF  (hidden comment: *)
Capacitor, Ceramic (MLCC), 5.6pF, 50V, NP0, SMD 0603; Manufacturer: Walsin Tech Corp; Manufacturer Part Number: 0603N5R6C500CT; Package Size: 0603; JLCPCB Basic Part: No; JLCPCB Part Number: C123584; Supplier 1: LCSC; Category: Capacitors - MLCC; Supplier Part Number 1: C123584; Voltage Rating: 50V; Temperature Coefficient: NP0; RoHS: Yes; ComponentLink1Description: Datasheet; ComponentLink1URL: https://wmsc.lcsc.com/wmsc/upload/file/pdf/v2/lcsc/2304140030_Walsin-Tech-Corp-0603N5R6C500CT_C123584.pdf; ComponentLink2Description: JLCPCB Part URL; ComponentLink2URL: https://jlcpcb.com/partdetail/C123584; ComponentLink3Description: LCSC Part URL; ComponentLink3URL: https://lcsc.com/product-detail/Multilayer-Ceramic-Capacitors-MLCC---SMD-SMT_Walsin-Tech-Corp-Walsin-Tech-Corp-0603N5R6C500CT_C123584.html
footprint CAP-0603 (0603 (1608M) Capacitor)
pins: 1, 2

## 0603N5R6D500CT
designator C?  Capacitance: 5.6pF  (hidden comment: *)
Capacitor, Ceramic (MLCC), 5.6pF, 50V, NP0, SMD 0603; Manufacturer: Walsin Tech Corp; Manufacturer Part Number: 0603N5R6D500CT; Package Size: 0603; JLCPCB Basic Part: No; JLCPCB Part Number: C388059; Supplier 1: LCSC; Category: Capacitors - MLCC; Supplier Part Number 1: C388059; Voltage Rating: 50V; Temperature Coefficient: NP0; RoHS: Yes; ComponentLink1Description: Datasheet; ComponentLink1URL: https://wmsc.lcsc.com/wmsc/upload/file/pdf/v2/lcsc/2304140030_Walsin-Tech-Corp-0603N5R6D500CT_C388059.pdf; ComponentLink2Description: JLCPCB Part URL; ComponentLink2URL: https://jlcpcb.com/partdetail/C388059; ComponentLink3Description: LCSC Part URL; ComponentLink3URL: https://lcsc.com/product-detail/Multilayer-Ceramic-Capacitors-MLCC---SMD-SMT_Walsin-Tech-Corp-Walsin-Tech-Corp-0603N5R6D500CT_C388059.html
footprint CAP-0603 (0603 (1608M) Capacitor)
pins: 1, 2

## 0603N6R0B500CT
designator C?  Capacitance: 6pF  (hidden comment: *)
Capacitor, Ceramic (MLCC), 6pF, 50V, NP0, SMD 0603; Manufacturer: Walsin Tech Corp; Manufacturer Part Number: 0603N6R0B500CT; Package Size: 0603; JLCPCB Basic Part: No; JLCPCB Part Number: C458907; Supplier 1: LCSC; Category: Capacitors - MLCC; Supplier Part Number 1: C458907; Voltage Rating: 50V; Temperature Coefficient: NP0; RoHS: Yes; ComponentLink1Description: Datasheet; ComponentLink1URL: https://wmsc.lcsc.com/wmsc/upload/file/pdf/v2/lcsc/2304140030_Walsin-Tech-Corp-0603N6R0B500CT_C458907.pdf; ComponentLink2Description: JLCPCB Part URL; ComponentLink2URL: https://jlcpcb.com/partdetail/C458907; ComponentLink3Description: LCSC Part URL; ComponentLink3URL: https://lcsc.com/product-detail/Multilayer-Ceramic-Capacitors-MLCC---SMD-SMT_Walsin-Tech-Corp-Walsin-Tech-Corp-0603N6R0B500CT_C458907.html
footprint CAP-0603 (0603 (1608M) Capacitor)
pins: 1, 2

## 0603N6R0C500CT
designator C?  Capacitance: 6pF  (hidden comment: *)
Capacitor, Ceramic (MLCC), 6pF, 50V, NP0, SMD 0603; Manufacturer: Walsin Tech Corp; Manufacturer Part Number: 0603N6R0C500CT; Package Size: 0603; JLCPCB Basic Part: No; JLCPCB Part Number: C388061; Supplier 1: LCSC; Category: Capacitors - MLCC; Supplier Part Number 1: C388061; Voltage Rating: 50V; Temperature Coefficient: NP0; RoHS: Yes; ComponentLink1Description: Datasheet; ComponentLink1URL: https://wmsc.lcsc.com/wmsc/upload/file/pdf/v2/lcsc/2304140030_Walsin-Tech-Corp-0603N6R0C500CT_C388061.pdf; ComponentLink2Description: JLCPCB Part URL; ComponentLink2URL: https://jlcpcb.com/partdetail/C388061; ComponentLink3Description: LCSC Part URL; ComponentLink3URL: https://lcsc.com/product-detail/Multilayer-Ceramic-Capacitors-MLCC---SMD-SMT_Walsin-Tech-Corp-Walsin-Tech-Corp-0603N6R0C500CT_C388061.html
footprint CAP-0603 (0603 (1608M) Capacitor)
pins: 1, 2

## 0603N6R2B500CT
designator C?  Capacitance: 6.2pF  (hidden comment: *)
Capacitor, Ceramic (MLCC), 6.2pF, 50V, NP0, SMD 0603; Manufacturer: Walsin Tech Corp; Manufacturer Part Number: 0603N6R2B500CT; Package Size: 0603; JLCPCB Basic Part: No; JLCPCB Part Number: C2764462; Supplier 1: LCSC; Category: Capacitors - MLCC; Supplier Part Number 1: C2764462; Voltage Rating: 50V; Temperature Coefficient: NP0; RoHS: Yes; ComponentLink1Description: Datasheet; ComponentLink1URL: https://wmsc.lcsc.com/wmsc/upload/file/pdf/v2/lcsc/2103311809_Walsin-Tech-Corp-0603N6R2B500CT_C2764462.pdf; ComponentLink2Description: JLCPCB Part URL; ComponentLink2URL: https://jlcpcb.com/partdetail/C2764462; ComponentLink3Description: LCSC Part URL; ComponentLink3URL: https://lcsc.com/product-detail/Multilayer-Ceramic-Capacitors-MLCC---SMD-SMT_Walsin-Tech-Corp-Walsin-Tech-Corp-0603N6R2B500CT_C2764462.html
footprint CAP-0603 (0603 (1608M) Capacitor)
pins: 1, 2

## 0603N6R2B500LT
designator C?  Capacitance: 6.2pF  (hidden comment: *)
Capacitor, Ceramic (MLCC), 6.2pF, 50V, NP0, SMD 0603; Manufacturer: Walsin Tech Corp; Manufacturer Part Number: 0603N6R2B500LT; Package Size: 0603; JLCPCB Basic Part: No; JLCPCB Part Number: C123589; Supplier 1: LCSC; Category: Capacitors - MLCC; Supplier Part Number 1: C123589; Voltage Rating: 50V; Temperature Coefficient: NP0; RoHS: Yes; ComponentLink1Description: Datasheet; ComponentLink1URL: https://wmsc.lcsc.com/wmsc/upload/file/pdf/v2/lcsc/2304140030_Walsin-Tech-Corp-0603N6R2B500LT_C123589.pdf; ComponentLink2Description: JLCPCB Part URL; ComponentLink2URL: https://jlcpcb.com/partdetail/C123589; ComponentLink3Description: LCSC Part URL; ComponentLink3URL: https://lcsc.com/product-detail/Multilayer-Ceramic-Capacitors-MLCC---SMD-SMT_Walsin-Tech-Corp-Walsin-Tech-Corp-0603N6R2B500LT_C123589.html
footprint CAP-0603 (0603 (1608M) Capacitor)
pins: 1, 2

## 0603N6R2C500
designator C?  Capacitance: 6.2pF  (hidden comment: *)
Capacitor, Ceramic (MLCC), 6.2pF, 50V, NP0, SMD 0603; Manufacturer: Walsin Tech Corp; Manufacturer Part Number: 0603N6R2C500; Package Size: 0603; JLCPCB Basic Part: No; JLCPCB Part Number: C123590; Supplier 1: LCSC; Category: Capacitors - MLCC; Supplier Part Number 1: C123590; Voltage Rating: 50V; Temperature Coefficient: NP0; RoHS: Yes; ComponentLink1Description: Datasheet; ComponentLink1URL: https://wmsc.lcsc.com/wmsc/upload/file/pdf/v2/lcsc/2304140030_Walsin-Tech-Corp-0603N6R2C500_C123590.pdf; ComponentLink2Description: JLCPCB Part URL; ComponentLink2URL: https://jlcpcb.com/partdetail/C123590; ComponentLink3Description: LCSC Part URL; ComponentLink3URL: https://lcsc.com/product-detail/Multilayer-Ceramic-Capacitors-MLCC---SMD-SMT_Walsin-Tech-Corp-Walsin-Tech-Corp-0603N6R2C500_C123590.html
footprint CAP-0603 (0603 (1608M) Capacitor)
pins: 1, 2

## 0603N6R8B500CT
designator C?  Capacitance: 6.8pF  (hidden comment: *)
Capacitor, Ceramic (MLCC), 6.8pF, 50V, NP0, SMD 0603; Manufacturer: Walsin Tech Corp; Manufacturer Part Number: 0603N6R8B500CT; Package Size: 0603; JLCPCB Basic Part: No; JLCPCB Part Number: C123591; Supplier 1: LCSC; Category: Capacitors - MLCC; Supplier Part Number 1: C123591; Voltage Rating: 50V; Temperature Coefficient: NP0; RoHS: Yes; ComponentLink1Description: Datasheet; ComponentLink1URL: https://wmsc.lcsc.com/wmsc/upload/file/pdf/v2/lcsc/2304140030_Walsin-Tech-Corp-0603N6R8B500CT_C123591.pdf; ComponentLink2Description: JLCPCB Part URL; ComponentLink2URL: https://jlcpcb.com/partdetail/C123591; ComponentLink3Description: LCSC Part URL; ComponentLink3URL: https://lcsc.com/product-detail/Multilayer-Ceramic-Capacitors-MLCC---SMD-SMT_Walsin-Tech-Corp-Walsin-Tech-Corp-0603N6R8B500CT_C123591.html
footprint CAP-0603 (0603 (1608M) Capacitor)
pins: 1, 2

## 0603N6R8C101CT
designator C?  Capacitance: 6.8pF  (hidden comment: *)
Capacitor, Ceramic (MLCC), 6.8pF, 100V, NP0, SMD 0603; Manufacturer: Walsin Tech Corp; Manufacturer Part Number: 0603N6R8C101CT; Package Size: 0603; JLCPCB Basic Part: No; JLCPCB Part Number: C458908; Supplier 1: LCSC; Category: Capacitors - MLCC; Supplier Part Number 1: C458908; Voltage Rating: 100V; Temperature Coefficient: NP0; RoHS: Yes; ComponentLink1Description: Datasheet; ComponentLink1URL: https://wmsc.lcsc.com/wmsc/upload/file/pdf/v2/lcsc/2304140030_Walsin-Tech-Corp-0603N6R8C101CT_C458908.pdf; ComponentLink2Description: JLCPCB Part URL; ComponentLink2URL: https://jlcpcb.com/partdetail/C458908; ComponentLink3Description: LCSC Part URL; ComponentLink3URL: https://lcsc.com/product-detail/Multilayer-Ceramic-Capacitors-MLCC---SMD-SMT_Walsin-Tech-Corp-Walsin-Tech-Corp-0603N6R8C101CT_C458908.html
footprint CAP-0603 (0603 (1608M) Capacitor)
pins: 1, 2

## 0603N6R8C500CT
designator C?  Capacitance: 6.8pF  (hidden comment: *)
Capacitor, Ceramic (MLCC), 6.8pF, 50V, NP0, SMD 0603; Manufacturer: Walsin Tech Corp; Manufacturer Part Number: 0603N6R8C500CT; Package Size: 0603; JLCPCB Basic Part: No; JLCPCB Part Number: C388062; Supplier 1: LCSC; Category: Capacitors - MLCC; Supplier Part Number 1: C388062; Voltage Rating: 50V; Temperature Coefficient: NP0; RoHS: Yes; ComponentLink1Description: Datasheet; ComponentLink1URL: https://wmsc.lcsc.com/wmsc/upload/file/pdf/v2/lcsc/2304140030_Walsin-Tech-Corp-0603N6R8C500CT_C388062.pdf; ComponentLink2Description: JLCPCB Part URL; ComponentLink2URL: https://jlcpcb.com/partdetail/C388062; ComponentLink3Description: LCSC Part URL; ComponentLink3URL: https://lcsc.com/product-detail/Multilayer-Ceramic-Capacitors-MLCC---SMD-SMT_Walsin-Tech-Corp-Walsin-Tech-Corp-0603N6R8C500CT_C388062.html
footprint CAP-0603 (0603 (1608M) Capacitor)
pins: 1, 2

## 0603N6R8D500CT
designator C?  Capacitance: 6.8pF  (hidden comment: *)
Capacitor, Ceramic (MLCC), 6.8pF, 50V, NP0, SMD 0603; Manufacturer: Walsin Tech Corp; Manufacturer Part Number: 0603N6R8D500CT; Package Size: 0603; JLCPCB Basic Part: No; JLCPCB Part Number: C314296; Supplier 1: LCSC; Category: Capacitors - MLCC; Supplier Part Number 1: C314296; Voltage Rating: 50V; Temperature Coefficient: NP0; RoHS: Yes; ComponentLink1Description: Datasheet; ComponentLink1URL: https://wmsc.lcsc.com/wmsc/upload/file/pdf/v2/lcsc/2304140030_Walsin-Tech-Corp-0603N6R8D500CT_C314296.pdf; ComponentLink2Description: JLCPCB Part URL; ComponentLink2URL: https://jlcpcb.com/partdetail/C314296; ComponentLink3Description: LCSC Part URL; ComponentLink3URL: https://lcsc.com/product-detail/Multilayer-Ceramic-Capacitors-MLCC---SMD-SMT_Walsin-Tech-Corp-Walsin-Tech-Corp-0603N6R8D500CT_C314296.html
footprint CAP-0603 (0603 (1608M) Capacitor)
pins: 1, 2

## 0603N7R0C500CT
designator C?  Capacitance: 7pF  (hidden comment: *)
Capacitor, Ceramic (MLCC), 7pF, 50V, NP0, SMD 0603; Manufacturer: Walsin Tech Corp; Manufacturer Part Number: 0603N7R0C500CT; Package Size: 0603; JLCPCB Basic Part: No; JLCPCB Part Number: C123594; Supplier 1: LCSC; Category: Capacitors - MLCC; Supplier Part Number 1: C123594; Voltage Rating: 50V; Temperature Coefficient: NP0; RoHS: Yes; ComponentLink1Description: Datasheet; ComponentLink1URL: https://wmsc.lcsc.com/wmsc/upload/file/pdf/v2/lcsc/2304140030_Walsin-Tech-Corp-0603N7R0C500CT_C123594.pdf; ComponentLink2Description: JLCPCB Part URL; ComponentLink2URL: https://jlcpcb.com/partdetail/C123594; ComponentLink3Description: LCSC Part URL; ComponentLink3URL: https://lcsc.com/product-detail/Multilayer-Ceramic-Capacitors-MLCC---SMD-SMT_Walsin-Tech-Corp-Walsin-Tech-Corp-0603N7R0C500CT_C123594.html
footprint CAP-0603 (0603 (1608M) Capacitor)
pins: 1, 2
